# Altium schematic symbol library jlcpcb_2025_04_resistors_extended_1210.schlib: 2670 symbols (part 14 of 14) (continued)
## SCR1210JR510
designator R?  Resistance: 510mΩ  (hidden comment: *)
Resistor, 510mΩ, ±5%, 500mW, 200V, -55℃~+155℃, SMD 1210; Manufacturer: Uniroyal; Manufacturer Part Number: SCR1210JR510; Supplier 1: LCSC; Supplier Part Number 1: C3018137; JLCPCB Part Number: C3018137; Power Rating: 500mW; Category: Resistors; Package Size: 1210; JLCPCB Basic Part: Yes; Tolerance: ±5%; Voltage Rating: 200V; Temperature Rating: -55℃~+155℃; ComponentLink1Description: Datasheet; ComponentLink1URL: https://wmsc.lcsc.com/wmsc/upload/file/pdf/v2/lcsc/2205131745_VO-SCR1210JR510_C3018137.pdf; ComponentLink2Description: JLCPCB Part URL; ComponentLink2URL: https://jlcpcb.com/partdetail/C3018137
pins: 1, 2
1 alternate drawing of the same symbol

## SCR1210JR910
designator R?  Resistance: 910mΩ  (hidden comment: *)
Resistor, 910mΩ, ±5%, 500mW, 200V, -55℃~+155℃, SMD 1210; Manufacturer: Uniroyal; Manufacturer Part Number: SCR1210JR910; Supplier 1: LCSC; Supplier Part Number 1: C3018150; JLCPCB Part Number: C3018150; Power Rating: 500mW; Category: Resistors; Package Size: 1210; JLCPCB Basic Part: Yes; Tolerance: ±5%; Voltage Rating: 200V; Temperature Rating: -55℃~+155℃; ComponentLink1Description: Datasheet; ComponentLink1URL: https://wmsc.lcsc.com/wmsc/upload/file/pdf/v2/lcsc/2205131745_VO-SCR1210JR910_C3018150.pdf; ComponentLink2Description: JLCPCB Part URL; ComponentLink2URL: https://jlcpcb.com/partdetail/C3018150
pins: 1, 2
1 alternate drawing of the same symbol

## SG732ETTD100K
designator R?  Resistance: 10Ω  (hidden comment: *)
Resistor, 10Ω, ±10%, 500mW, ±200ppm/℃, -55℃~+155℃, SMD 1210; Manufacturer: Uniroyal; Manufacturer Part Number: SG732ETTD100K; Supplier 1: LCSC; Supplier Part Number 1: C782243; JLCPCB Part Number: C782243; Power Rating: 500mW; Category: Resistors; Package Size: 1210; JLCPCB Basic Part: Yes; Tolerance: ±10%; Temperature Coefficient: ±200ppm/℃; Temperature Rating: -55℃~+155℃; ComponentLink1Description: Datasheet; ComponentLink1URL: https://wmsc.lcsc.com/wmsc/upload/file/pdf/v2/lcsc/2009101908_KOA-Speer-Elec-SG732ETTD100K_C782243.pdf; ComponentLink2Description: JLCPCB Part URL; ComponentLink2URL: https://jlcpcb.com/partdetail/C782243
pins: 1, 2
1 alternate drawing of the same symbol

## SR1210JR-077R5L
designator R?  Resistance: 7.5Ω  (hidden comment: *)
Resistor, 7.5Ω, ±5%, 500mW, 200V, ±200ppm/℃, -55℃~+155℃, SMD 1210; Manufacturer: Uniroyal; Manufacturer Part Number: SR1210JR-077R5L; Supplier 1: LCSC; Supplier Part Number 1: C723671; JLCPCB Part Number: C723671; Power Rating: 500mW; Category: Resistors; Package Size: 1210; JLCPCB Basic Part: Yes; Tolerance: ±5%; Voltage Rating: 200V; Temperature Coefficient: ±200ppm/℃; Temperature Rating: -55℃~+155℃; ComponentLink1Description: Datasheet; ComponentLink1URL: https://wmsc.lcsc.com/wmsc/upload/file/pdf/v2/lcsc/2304140030_YAGEO-SR1210JR-077R5L_C723671.pdf; ComponentLink2Description: JLCPCB Part URL; ComponentLink2URL: https://jlcpcb.com/partdetail/C723671
pins: 1, 2
1 alternate drawing of the same symbol

## SR1210JR-0710RL
designator R?  Resistance: 10Ω  (hidden comment: *)
Resistor, 10Ω, ±5%, 500mW, ±200ppm/℃, -55℃~+155℃, SMD 1210; Manufacturer: Uniroyal; Manufacturer Part Number: SR1210JR-0710RL; Supplier 1: LCSC; Supplier Part Number 1: C874105; JLCPCB Part Number: C874105; Power Rating: 500mW; Category: Resistors; Package Size: 1210; JLCPCB Basic Part: Yes; Tolerance: ±5%; Temperature Coefficient: ±200ppm/℃; Temperature Rating: -55℃~+155℃; ComponentLink1Description: Datasheet; ComponentLink1URL: https://wmsc.lcsc.com/wmsc/upload/file/pdf/v2/lcsc/2311211102_YAGEO-SR1210JR-0710RL_C874105.pdf; ComponentLink2Description: JLCPCB Part URL; ComponentLink2URL: https://jlcpcb.com/partdetail/C874105
pins: 1, 2
1 alternate drawing of the same symbol

## SWR13JTEU0220
designator R?  Resistance: 22Ω  (hidden comment: *)
Resistor, 22Ω, ±5%, 500mW, 200V, ±100ppm/℃, -55℃~+155℃, SMD 1210; Manufacturer: Uniroyal; Manufacturer Part Number: SWR13JTEU0220; Supplier 1: LCSC; Supplier Part Number 1: C408951; JLCPCB Part Number: C408951; Power Rating: 500mW; Category: Resistors; Package Size: 1210; JLCPCB Basic Part: Yes; Tolerance: ±5%; Voltage Rating: 200V; Temperature Coefficient: ±100ppm/℃; Temperature Rating: -55℃~+155℃; ComponentLink1Description: Datasheet; ComponentLink1URL: https://wmsc.lcsc.com/wmsc/upload/file/pdf/v2/lcsc/1912111437_Viking-Tech-SWR13JTEU0220_C408951.pdf; ComponentLink2Description: JLCPCB Part URL; ComponentLink2URL: https://jlcpcb.com/partdetail/C408951
pins: 1, 2
1 alternate drawing of the same symbol

## TC0725B249JT5K
designator R?  Resistance: 24.9Ω  (hidden comment: *)
Resistor, 24.9Ω, ±0.1%, 333.333mW, ±25ppm/℃, SMD 1210; Manufacturer: Uniroyal; Manufacturer Part Number: TC0725B249JT5K; Supplier 1: LCSC; Supplier Part Number 1: C517711; JLCPCB Part Number: C517711; Power Rating: 333.333mW; Category: Resistors; Package Size: 1210; JLCPCB Basic Part: Yes; Tolerance: ±0.1%; Temperature Coefficient: ±25ppm/℃; ComponentLink1Description: Datasheet; ComponentLink1URL: https://wmsc.lcsc.com/wmsc/upload/file/pdf/v2/lcsc/2304140030_UNI-ROYAL-Uniroyal-Elec-TC0725B249JT5K_C517711.pdf; ComponentLink2Description: JLCPCB Part URL; ComponentLink2URL: https://jlcpcb.com/partdetail/C517711
pins: 1, 2
1 alternate drawing of the same symbol

## TC0725B4992T5K
designator R?  Resistance: 49.9kΩ  (hidden comment: *)
Resistor, 49.9kΩ, ±0.1%, 333.333mW, ±25ppm/℃, SMD 1210; Manufacturer: Uniroyal; Manufacturer Part Number: TC0725B4992T5K; Supplier 1: LCSC; Supplier Part Number 1: C517798; JLCPCB Part Number: C517798; Power Rating: 333.333mW; Category: Resistors; Package Size: 1210; JLCPCB Basic Part: Yes; Tolerance: ±0.1%; Temperature Coefficient: ±25ppm/℃; ComponentLink1Description: Datasheet; ComponentLink1URL: https://wmsc.lcsc.com/wmsc/upload/file/pdf/v2/lcsc/2304140030_UNI-ROYAL-Uniroyal-Elec-TC0725B4992T5K_C517798.pdf; ComponentLink2Description: JLCPCB Part URL; ComponentLink2URL: https://jlcpcb.com/partdetail/C517798
pins: 1, 2
1 alternate drawing of the same symbol

## TC0750B3903T5K
designator R?  Resistance: 390kΩ  (hidden comment: *)
Resistor, 390kΩ, ±0.1%, 333.333mW, ±50ppm/℃, SMD 1210; Manufacturer: Uniroyal; Manufacturer Part Number: TC0750B3903T5K; Supplier 1: LCSC; Supplier Part Number 1: C517610; JLCPCB Part Number: C517610; Power Rating: 333.333mW; Category: Resistors; Package Size: 1210; JLCPCB Basic Part: Yes; Tolerance: ±0.1%; Temperature Coefficient: ±50ppm/℃; ComponentLink1Description: Datasheet; ComponentLink1URL: https://wmsc.lcsc.com/wmsc/upload/file/pdf/v2/lcsc/2304140030_UNI-ROYAL-Uniroyal-Elec-TC0750B3903T5K_C517610.pdf; ComponentLink2Description: JLCPCB Part URL; ComponentLink2URL: https://jlcpcb.com/partdetail/C517610
pins: 1, 2
1 alternate drawing of the same symbol

## TR1210B100RP0550Z
designator R?  Resistance: 100Ω  (hidden comment: *)
Resistor, 100Ω, ±0.1%, 250mW, 200V, ±50ppm/℃, -55℃~+155℃, SMD 1210; Manufacturer: Uniroyal; Manufacturer Part Number: TR1210B100RP0550Z; Supplier 1: LCSC; Supplier Part Number 1: C153399; JLCPCB Part Number: C153399; Power Rating: 250mW; Category: Resistors; Package Size: 1210; JLCPCB Basic Part: Yes; Tolerance: ±0.1%; Voltage Rating: 200V; Temperature Coefficient: ±50ppm/℃; Temperature Rating: -55℃~+155℃; ComponentLink1Description: Datasheet; ComponentLink1URL: https://wmsc.lcsc.com/wmsc/upload/file/pdf/v2/lcsc/2304140030_Ever-Ohms-Tech-TR1210B100RP0550Z_C153399.pdf; ComponentLink2Description: JLCPCB Part URL; ComponentLink2URL: https://jlcpcb.com/partdetail/C153399
pins: 1, 2
1 alternate drawing of the same symbol

## TR1210D261KP0525
designator R?  Resistance: 261kΩ  (hidden comment: *)
Resistor, 261kΩ, ±0.5%, 250mW, 200V, ±25ppm/℃, -55℃~+155℃, SMD 1210; Manufacturer: Uniroyal; Manufacturer Part Number: TR1210D261KP0525; Supplier 1: LCSC; Supplier Part Number 1: C153314; JLCPCB Part Number: C153314; Power Rating: 250mW; Category: Resistors; Package Size: 1210; JLCPCB Basic Part: Yes; Tolerance: ±0.5%; Voltage Rating: 200V; Temperature Coefficient: ±25ppm/℃; Temperature Rating: -55℃~+155℃; ComponentLink1Description: Datasheet; ComponentLink1URL: https://wmsc.lcsc.com/wmsc/upload/file/pdf/v2/lcsc/2304140030_Ever-Ohms-Tech-TR1210D261KP0525_C153314.pdf; ComponentLink2Description: JLCPCB Part URL; ComponentLink2URL: https://jlcpcb.com/partdetail/C153314
pins: 1, 2
1 alternate drawing of the same symbol

## WR10W1R00FTL
designator R?  Resistance: 1Ω  (hidden comment: *)
Resistor, 1Ω, ±1%, 333.333mW, 200V, -200ppm/℃~+400ppm/℃, -55℃~+155℃, SMD 1210; Manufacturer: Uniroyal; Manufacturer Part Number: WR10W1R00FTL; Supplier 1: LCSC; Supplier Part Number 1: C171204; JLCPCB Part Number: C171204; Power Rating: 333.333mW; Category: Resistors; Package Size: 1210; JLCPCB Basic Part: Yes; Tolerance: ±1%; Voltage Rating: 200V; Temperature Coefficient: -200ppm/℃~+400ppm/℃; Temperature Rating: -55℃~+155℃; ComponentLink1Description: Datasheet; ComponentLink1URL: https://wmsc.lcsc.com/wmsc/upload/file/pdf/v2/lcsc/2304140030_Walsin-Tech-Corp-WR10W1R00FTL_C171204.pdf; ComponentLink2Description: JLCPCB Part URL; ComponentLink2URL: https://jlcpcb.com/partdetail/C171204
pins: 1, 2
1 alternate drawing of the same symbol

## WR10W6R80FTL
designator R?  Resistance: 6.8Ω  (hidden comment: *)
Resistor, 6.8Ω, ±1%, 333.333mW, 200V, -200ppm/℃~+400ppm/℃, -55℃~+155℃, SMD 1210; Manufacturer: Uniroyal; Manufacturer Part Number: WR10W6R80FTL; Supplier 1: LCSC; Supplier Part Number 1: C171209; JLCPCB Part Number: C171209; Power Rating: 333.333mW; Category: Resistors; Package Size: 1210; JLCPCB Basic Part: Yes; Tolerance: ±1%; Voltage Rating: 200V; Temperature Coefficient: -200ppm/℃~+400ppm/℃; Temperature Rating: -55℃~+155℃; ComponentLink1Description: Datasheet; ComponentLink1URL: https://wmsc.lcsc.com/wmsc/upload/file/pdf/v2/lcsc/2304140030_Walsin-Tech-Corp-WR10W6R80FTL_C171209.pdf; ComponentLink2Description: JLCPCB Part URL; ComponentLink2URL: https://jlcpcb.com/partdetail/C171209
pins: 1, 2
1 alternate drawing of the same symbol

## WR10X000PTL
designator R?  Resistance: 0Ω  (hidden comment: *)
Resistor, 0Ω, 333.333mW, 200V, -200ppm/℃~+400ppm/℃, -55℃~+155℃, SMD 1210; Manufacturer: Uniroyal; Manufacturer Part Number: WR10X000PTL; Supplier 1: LCSC; Supplier Part Number 1: C168595; JLCPCB Part Number: C168595; Power Rating: 333.333mW; Category: Resistors; Package Size: 1210; JLCPCB Basic Part: Yes; Voltage Rating: 200V; Temperature Coefficient: -200ppm/℃~+400ppm/℃; Temperature Rating: -55℃~+155℃; ComponentLink1Description: Datasheet; ComponentLink1URL: https://wmsc.lcsc.com/wmsc/upload/file/pdf/v2/lcsc/2304140030_Walsin-Tech-Corp-WR10X000PTL_C168595.pdf; ComponentLink2Description: JLCPCB Part URL; ComponentLink2URL: https://jlcpcb.com/partdetail/C168595
pins: 1, 2
1 alternate drawing of the same symbol

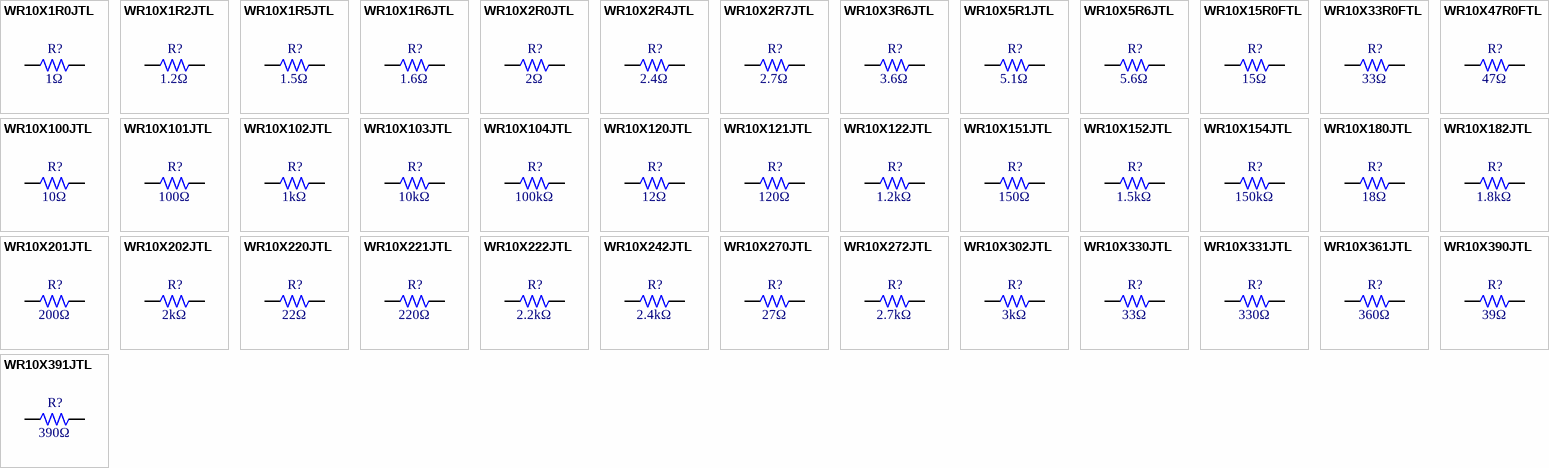
[diagram p65: symbols WR10X1R0JTL to WR10X391JTL]

## WR10X1R0JTL
designator R?  Resistance: 1Ω  (hidden comment: *)
Resistor, 1Ω, ±5%, 333.333mW, 200V, ±200ppm/℃, -55℃~+155℃, SMD 1210; Manufacturer: Uniroyal; Manufacturer Part Number: WR10X1R0JTL; Supplier 1: LCSC; Supplier Part Number 1: C171220; JLCPCB Part Number: C171220; Power Rating: 333.333mW; Category: Resistors; Package Size: 1210; JLCPCB Basic Part: Yes; Tolerance: ±5%; Voltage Rating: 200V; Temperature Coefficient: ±200ppm/℃; Temperature Rating: -55℃~+155℃; ComponentLink1Description: Datasheet; ComponentLink1URL: https://wmsc.lcsc.com/wmsc/upload/file/pdf/v2/lcsc/2304140030_Walsin-Tech-Corp-WR10X1R0JTL_C171220.pdf; ComponentLink2Description: JLCPCB Part URL; ComponentLink2URL: https://jlcpcb.com/partdetail/C171220
pins: 1, 2
1 alternate drawing of the same symbol

## WR10X1R2JTL
designator R?  Resistance: 1.2Ω  (hidden comment: *)
Resistor, 1.2Ω, ±5%, 333.333mW, 200V, -200ppm/℃~+400ppm/℃, -55℃~+155℃, SMD 1210; Manufacturer: Uniroyal; Manufacturer Part Number: WR10X1R2JTL; Supplier 1: LCSC; Supplier Part Number 1: C171221; JLCPCB Part Number: C171221; Power Rating: 333.333mW; Category: Resistors; Package Size: 1210; JLCPCB Basic Part: Yes; Tolerance: ±5%; Voltage Rating: 200V; Temperature Coefficient: -200ppm/℃~+400ppm/℃; Temperature Rating: -55℃~+155℃; ComponentLink1Description: Datasheet; ComponentLink1URL: https://wmsc.lcsc.com/wmsc/upload/file/pdf/v2/lcsc/2304140030_Walsin-Tech-Corp-WR10X1R2JTL_C171221.pdf; ComponentLink2Description: JLCPCB Part URL; ComponentLink2URL: https://jlcpcb.com/partdetail/C171221
pins: 1, 2
1 alternate drawing of the same symbol

## WR10X1R5JTL
designator R?  Resistance: 1.5Ω  (hidden comment: *)
Resistor, 1.5Ω, ±5%, 333.333mW, 200V, -200ppm/℃~+400ppm/℃, -55℃~+155℃, SMD 1210; Manufacturer: Uniroyal; Manufacturer Part Number: WR10X1R5JTL; Supplier 1: LCSC; Supplier Part Number 1: C171222; JLCPCB Part Number: C171222; Power Rating: 333.333mW; Category: Resistors; Package Size: 1210; JLCPCB Basic Part: Yes; Tolerance: ±5%; Voltage Rating: 200V; Temperature Coefficient: -200ppm/℃~+400ppm/℃; Temperature Rating: -55℃~+155℃; ComponentLink1Description: Datasheet; ComponentLink1URL: https://wmsc.lcsc.com/wmsc/upload/file/pdf/v2/lcsc/1810162141_Walsin-Tech-Corp-WR10X1R5JTL_C171222.pdf; ComponentLink2Description: JLCPCB Part URL; ComponentLink2URL: https://jlcpcb.com/partdetail/C171222
pins: 1, 2
1 alternate drawing of the same symbol

## WR10X1R6JTL
designator R?  Resistance: 1.6Ω  (hidden comment: *)
Resistor, 1.6Ω, ±5%, 333.333mW, 200V, ±200ppm/℃, -55℃~+155℃, SMD 1210; Manufacturer: Uniroyal; Manufacturer Part Number: WR10X1R6JTL; Supplier 1: LCSC; Supplier Part Number 1: C470035; JLCPCB Part Number: C470035; Power Rating: 333.333mW; Category: Resistors; Package Size: 1210; JLCPCB Basic Part: Yes; Tolerance: ±5%; Voltage Rating: 200V; Temperature Coefficient: ±200ppm/℃; Temperature Rating: -55℃~+155℃; ComponentLink1Description: Datasheet; ComponentLink1URL: https://wmsc.lcsc.com/wmsc/upload/file/pdf/v2/lcsc/1912210907_Walsin-Tech-Corp-WR10X1R6JTL_C470035.pdf; ComponentLink2Description: JLCPCB Part URL; ComponentLink2URL: https://jlcpcb.com/partdetail/C470035
pins: 1, 2
1 alternate drawing of the same symbol

## WR10X2R0JTL
designator R?  Resistance: 2Ω  (hidden comment: *)
Resistor, 2Ω, ±5%, 333.333mW, 200V, -200ppm/℃~+400ppm/℃, -55℃~+155℃, SMD 1210; Manufacturer: Uniroyal; Manufacturer Part Number: WR10X2R0JTL; Supplier 1: LCSC; Supplier Part Number 1: C171232; JLCPCB Part Number: C171232; Power Rating: 333.333mW; Category: Resistors; Package Size: 1210; JLCPCB Basic Part: Yes; Tolerance: ±5%; Voltage Rating: 200V; Temperature Coefficient: -200ppm/℃~+400ppm/℃; Temperature Rating: -55℃~+155℃; ComponentLink1Description: Datasheet; ComponentLink1URL: https://wmsc.lcsc.com/wmsc/upload/file/pdf/v2/lcsc/2304140030_Walsin-Tech-Corp-WR10X2R0JTL_C171232.pdf; ComponentLink2Description: JLCPCB Part URL; ComponentLink2URL: https://jlcpcb.com/partdetail/C171232
pins: 1, 2
1 alternate drawing of the same symbol

## WR10X2R4JTL
designator R?  Resistance: 2.4Ω  (hidden comment: *)
Resistor, 2.4Ω, ±5%, 333.333mW, 200V, -200ppm/℃~+400ppm/℃, -55℃~+155℃, SMD 1210; Manufacturer: Uniroyal; Manufacturer Part Number: WR10X2R4JTL; Supplier 1: LCSC; Supplier Part Number 1: C171234; JLCPCB Part Number: C171234; Power Rating: 333.333mW; Category: Resistors; Package Size: 1210; JLCPCB Basic Part: Yes; Tolerance: ±5%; Voltage Rating: 200V; Temperature Coefficient: -200ppm/℃~+400ppm/℃; Temperature Rating: -55℃~+155℃; ComponentLink1Description: Datasheet; ComponentLink1URL: https://wmsc.lcsc.com/wmsc/upload/file/pdf/v2/lcsc/2304140030_Walsin-Tech-Corp-WR10X2R4JTL_C171234.pdf; ComponentLink2Description: JLCPCB Part URL; ComponentLink2URL: https://jlcpcb.com/partdetail/C171234
pins: 1, 2
1 alternate drawing of the same symbol

## WR10X2R7JTL
designator R?  Resistance: 2.7Ω  (hidden comment: *)
Resistor, 2.7Ω, ±5%, 333.333mW, 200V, ±200ppm/℃, -55℃~+155℃, SMD 1210; Manufacturer: Uniroyal; Manufacturer Part Number: WR10X2R7JTL; Supplier 1: LCSC; Supplier Part Number 1: C470036; JLCPCB Part Number: C470036; Power Rating: 333.333mW; Category: Resistors; Package Size: 1210; JLCPCB Basic Part: Yes; Tolerance: ±5%; Voltage Rating: 200V; Temperature Coefficient: ±200ppm/℃; Temperature Rating: -55℃~+155℃; ComponentLink1Description: Datasheet; ComponentLink1URL: https://wmsc.lcsc.com/wmsc/upload/file/pdf/v2/lcsc/2304140030_Walsin-Tech-Corp-WR10X2R7JTL_C470036.pdf; ComponentLink2Description: JLCPCB Part URL; ComponentLink2URL: https://jlcpcb.com/partdetail/C470036
pins: 1, 2
1 alternate drawing of the same symbol

## WR10X3R6JTL
designator R?  Resistance: 3.6Ω  (hidden comment: *)
Resistor, 3.6Ω, ±5%, 333.333mW, 200V, -200ppm/℃~+400ppm/℃, -55℃~+155℃, SMD 1210; Manufacturer: Uniroyal; Manufacturer Part Number: WR10X3R6JTL; Supplier 1: LCSC; Supplier Part Number 1: C396216; JLCPCB Part Number: C396216; Power Rating: 333.333mW; Category: Resistors; Package Size: 1210; JLCPCB Basic Part: Yes; Tolerance: ±5%; Voltage Rating: 200V; Temperature Coefficient: -200ppm/℃~+400ppm/℃; Temperature Rating: -55℃~+155℃; ComponentLink1Description: Datasheet; ComponentLink1URL: https://wmsc.lcsc.com/wmsc/upload/file/pdf/v2/lcsc/2304140030_Walsin-Tech-Corp-WR10X3R6JTL_C396216.pdf; ComponentLink2Description: JLCPCB Part URL; ComponentLink2URL: https://jlcpcb.com/partdetail/C396216
pins: 1, 2
1 alternate drawing of the same symbol

## WR10X5R1JTL
designator R?  Resistance: 5.1Ω  (hidden comment: *)
Resistor, 5.1Ω, ±5%, 333.333mW, 200V, -200ppm/℃~+400ppm/℃, -55℃~+155℃, SMD 1210; Manufacturer: Uniroyal; Manufacturer Part Number: WR10X5R1JTL; Supplier 1: LCSC; Supplier Part Number 1: C171251; JLCPCB Part Number: C171251; Power Rating: 333.333mW; Category: Resistors; Package Size: 1210; JLCPCB Basic Part: Yes; Tolerance: ±5%; Voltage Rating: 200V; Temperature Coefficient: -200ppm/℃~+400ppm/℃; Temperature Rating: -55℃~+155℃; ComponentLink1Description: Datasheet; ComponentLink1URL: https://wmsc.lcsc.com/wmsc/upload/file/pdf/v2/lcsc/2304140030_Walsin-Tech-Corp-WR10X5R1JTL_C171251.pdf; ComponentLink2Description: JLCPCB Part URL; ComponentLink2URL: https://jlcpcb.com/partdetail/C171251
pins: 1, 2
1 alternate drawing of the same symbol

## WR10X5R6JTL
designator R?  Resistance: 5.6Ω  (hidden comment: *)
Resistor, 5.6Ω, ±5%, 333.333mW, 200V, -200ppm/℃~+400ppm/℃, -55℃~+155℃, SMD 1210; Manufacturer: Uniroyal; Manufacturer Part Number: WR10X5R6JTL; Supplier 1: LCSC; Supplier Part Number 1: C171252; JLCPCB Part Number: C171252; Power Rating: 333.333mW; Category: Resistors; Package Size: 1210; JLCPCB Basic Part: Yes; Tolerance: ±5%; Voltage Rating: 200V; Temperature Coefficient: -200ppm/℃~+400ppm/℃; Temperature Rating: -55℃~+155℃; ComponentLink1Description: Datasheet; ComponentLink1URL: https://wmsc.lcsc.com/wmsc/upload/file/pdf/v2/lcsc/2304140030_Walsin-Tech-Corp-WR10X5R6JTL_C171252.pdf; ComponentLink2Description: JLCPCB Part URL; ComponentLink2URL: https://jlcpcb.com/partdetail/C171252
pins: 1, 2
1 alternate drawing of the same symbol

## WR10X15R0FTL
designator R?  Resistance: 15Ω  (hidden comment: *)
Resistor, 15Ω, ±1%, 333.333mW, ±100ppm/℃, SMD 1210; Manufacturer: Uniroyal; Manufacturer Part Number: WR10X15R0FTL; Supplier 1: LCSC; Supplier Part Number 1: C384050; JLCPCB Part Number: C384050; Power Rating: 333.333mW; Category: Resistors; Package Size: 1210; JLCPCB Basic Part: Yes; Tolerance: ±1%; Temperature Coefficient: ±100ppm/℃; ComponentLink1Description: Datasheet; ComponentLink1URL: https://wmsc.lcsc.com/wmsc/upload/file/pdf/v2/lcsc/2304140030_Walsin-Tech-Corp-WR10X15R0FTL_C384050.pdf; ComponentLink2Description: JLCPCB Part URL; ComponentLink2URL: https://jlcpcb.com/partdetail/C384050
pins: 1, 2
1 alternate drawing of the same symbol

## WR10X33R0FTL
designator R?  Resistance: 33Ω  (hidden comment: *)
Resistor, 33Ω, ±1%, 50mW, 25V, ±200ppm/℃, -55℃~+125℃, SMD 1210; Manufacturer: Uniroyal; Manufacturer Part Number: WR10X33R0FTL; Supplier 1: LCSC; Supplier Part Number 1: C2894216; JLCPCB Part Number: C2894216; Power Rating: 50mW; Category: Resistors; Package Size: 1210; JLCPCB Basic Part: Yes; Tolerance: ±1%; Voltage Rating: 25V; Temperature Coefficient: ±200ppm/℃; Temperature Rating: -55℃~+125℃; ComponentLink1Description: Datasheet; ComponentLink1URL: https://wmsc.lcsc.com/wmsc/upload/file/pdf/v2/lcsc/2109081830_Walsin-Tech-Corp-WR10X33R0FTL_C2894216.pdf; ComponentLink2Description: JLCPCB Part URL; ComponentLink2URL: https://jlcpcb.com/partdetail/C2894216
pins: 1, 2
1 alternate drawing of the same symbol

## WR10X47R0FTL
designator R?  Resistance: 47Ω  (hidden comment: *)
Resistor, 47Ω, ±1%, 333.333mW, 200V, ±100ppm/℃, -55℃~+155℃, SMD 1210; Manufacturer: Uniroyal; Manufacturer Part Number: WR10X47R0FTL; Supplier 1: LCSC; Supplier Part Number 1: C335013; JLCPCB Part Number: C335013; Power Rating: 333.333mW; Category: Resistors; Package Size: 1210; JLCPCB Basic Part: Yes; Tolerance: ±1%; Voltage Rating: 200V; Temperature Coefficient: ±100ppm/℃; Temperature Rating: -55℃~+155℃; ComponentLink1Description: Datasheet; ComponentLink1URL: https://wmsc.lcsc.com/wmsc/upload/file/pdf/v2/lcsc/2304140030_Walsin-Tech-Corp-WR10X47R0FTL_C335013.pdf; ComponentLink2Description: JLCPCB Part URL; ComponentLink2URL: https://jlcpcb.com/partdetail/C335013
pins: 1, 2
1 alternate drawing of the same symbol

## WR10X100JTL
designator R?  Resistance: 10Ω  (hidden comment: *)
Resistor, 10Ω, ±5%, 333.333mW, 200V, ±200ppm/℃, -55℃~+155℃, SMD 1210; Manufacturer: Uniroyal; Manufacturer Part Number: WR10X100JTL; Supplier 1: LCSC; Supplier Part Number 1: C396213; JLCPCB Part Number: C396213; Power Rating: 333.333mW; Category: Resistors; Package Size: 1210; JLCPCB Basic Part: Yes; Tolerance: ±5%; Voltage Rating: 200V; Temperature Coefficient: ±200ppm/℃; Temperature Rating: -55℃~+155℃; ComponentLink1Description: Datasheet; ComponentLink1URL: https://wmsc.lcsc.com/wmsc/upload/file/pdf/v2/lcsc/2110281730_Walsin-Tech-Corp-WR10X100JTL_C396213.pdf; ComponentLink2Description: JLCPCB Part URL; ComponentLink2URL: https://jlcpcb.com/partdetail/C396213
pins: 1, 2
1 alternate drawing of the same symbol

## WR10X101JTL
designator R?  Resistance: 100Ω  (hidden comment: *)
Resistor, 100Ω, ±5%, 333.333mW, 200V, ±100ppm/℃, -55℃~+155℃, SMD 1210; Manufacturer: Uniroyal; Manufacturer Part Number: WR10X101JTL; Supplier 1: LCSC; Supplier Part Number 1: C168597; JLCPCB Part Number: C168597; Power Rating: 333.333mW; Category: Resistors; Package Size: 1210; JLCPCB Basic Part: Yes; Tolerance: ±5%; Voltage Rating: 200V; Temperature Coefficient: ±100ppm/℃; Temperature Rating: -55℃~+155℃; ComponentLink1Description: Datasheet; ComponentLink1URL: https://wmsc.lcsc.com/wmsc/upload/file/pdf/v2/lcsc/2304140030_Walsin-Tech-Corp-WR10X101JTL_C168597.pdf; ComponentLink2Description: JLCPCB Part URL; ComponentLink2URL: https://jlcpcb.com/partdetail/C168597
pins: 1, 2
1 alternate drawing of the same symbol

## WR10X102JTL
designator R?  Resistance: 1kΩ  (hidden comment: *)
Resistor, 1kΩ, ±5%, 333.333mW, 200V, ±100ppm/℃, -55℃~+155℃, SMD 1210; Manufacturer: Uniroyal; Manufacturer Part Number: WR10X102JTL; Supplier 1: LCSC; Supplier Part Number 1: C171210; JLCPCB Part Number: C171210; Power Rating: 333.333mW; Category: Resistors; Package Size: 1210; JLCPCB Basic Part: Yes; Tolerance: ±5%; Voltage Rating: 200V; Temperature Coefficient: ±100ppm/℃; Temperature Rating: -55℃~+155℃; ComponentLink1Description: Datasheet; ComponentLink1URL: https://wmsc.lcsc.com/wmsc/upload/file/pdf/v2/lcsc/2304140030_Walsin-Tech-Corp-WR10X102JTL_C171210.pdf; ComponentLink2Description: JLCPCB Part URL; ComponentLink2URL: https://jlcpcb.com/partdetail/C171210
pins: 1, 2
1 alternate drawing of the same symbol

## WR10X103JTL
designator R?  Resistance: 10kΩ  (hidden comment: *)
Resistor, 10kΩ, ±5%, 333.333mW, 200V, ±100ppm/℃, -55℃~+155℃, SMD 1210; Manufacturer: Uniroyal; Manufacturer Part Number: WR10X103JTL; Supplier 1: LCSC; Supplier Part Number 1: C171211; JLCPCB Part Number: C171211; Power Rating: 333.333mW; Category: Resistors; Package Size: 1210; JLCPCB Basic Part: Yes; Tolerance: ±5%; Voltage Rating: 200V; Temperature Coefficient: ±100ppm/℃; Temperature Rating: -55℃~+155℃; ComponentLink1Description: Datasheet; ComponentLink1URL: https://wmsc.lcsc.com/wmsc/upload/file/pdf/v2/lcsc/2304140030_Walsin-Tech-Corp-WR10X103JTL_C171211.pdf; ComponentLink2Description: JLCPCB Part URL; ComponentLink2URL: https://jlcpcb.com/partdetail/C171211
pins: 1, 2
1 alternate drawing of the same symbol

## WR10X104JTL
designator R?  Resistance: 100kΩ  (hidden comment: *)
Resistor, 100kΩ, ±5%, 333.333mW, 200V, ±100ppm/℃, -55℃~+155℃, SMD 1210; Manufacturer: Uniroyal; Manufacturer Part Number: WR10X104JTL; Supplier 1: LCSC; Supplier Part Number 1: C171254; JLCPCB Part Number: C171254; Power Rating: 333.333mW; Category: Resistors; Package Size: 1210; JLCPCB Basic Part: Yes; Tolerance: ±5%; Voltage Rating: 200V; Temperature Coefficient: ±100ppm/℃; Temperature Rating: -55℃~+155℃; ComponentLink1Description: Datasheet; ComponentLink1URL: https://wmsc.lcsc.com/wmsc/upload/file/pdf/v2/lcsc/2304140030_Walsin-Tech-Corp-WR10X104JTL_C171254.pdf; ComponentLink2Description: JLCPCB Part URL; ComponentLink2URL: https://jlcpcb.com/partdetail/C171254
pins: 1, 2
1 alternate drawing of the same symbol

## WR10X120JTL
designator R?  Resistance: 12Ω  (hidden comment: *)
Resistor, 12Ω, ±5%, 333.333mW, 200V, ±100ppm/℃, -55℃~+155℃, SMD 1210; Manufacturer: Uniroyal; Manufacturer Part Number: WR10X120JTL; Supplier 1: LCSC; Supplier Part Number 1: C171213; JLCPCB Part Number: C171213; Power Rating: 333.333mW; Category: Resistors; Package Size: 1210; JLCPCB Basic Part: Yes; Tolerance: ±5%; Voltage Rating: 200V; Temperature Coefficient: ±100ppm/℃; Temperature Rating: -55℃~+155℃; ComponentLink1Description: Datasheet; ComponentLink1URL: https://wmsc.lcsc.com/wmsc/upload/file/pdf/v2/lcsc/2304140030_Walsin-Tech-Corp-WR10X120JTL_C171213.pdf; ComponentLink2Description: JLCPCB Part URL; ComponentLink2URL: https://jlcpcb.com/partdetail/C171213
pins: 1, 2
1 alternate drawing of the same symbol

## WR10X121JTL
designator R?  Resistance: 120Ω  (hidden comment: *)
Resistor, 120Ω, ±5%, 333.333mW, 200V, ±100ppm/℃, -55℃~+155℃, SMD 1210; Manufacturer: Uniroyal; Manufacturer Part Number: WR10X121JTL; Supplier 1: LCSC; Supplier Part Number 1: C171214; JLCPCB Part Number: C171214; Power Rating: 333.333mW; Category: Resistors; Package Size: 1210; JLCPCB Basic Part: Yes; Tolerance: ±5%; Voltage Rating: 200V; Temperature Coefficient: ±100ppm/℃; Temperature Rating: -55℃~+155℃; ComponentLink1Description: Datasheet; ComponentLink1URL: https://wmsc.lcsc.com/wmsc/upload/file/pdf/v2/lcsc/2304140030_Walsin-Tech-Corp-WR10X121JTL_C171214.pdf; ComponentLink2Description: JLCPCB Part URL; ComponentLink2URL: https://jlcpcb.com/partdetail/C171214
pins: 1, 2
1 alternate drawing of the same symbol

## WR10X122JTL
designator R?  Resistance: 1.2kΩ  (hidden comment: *)
Resistor, 1.2kΩ, ±5%, 333.333mW, 200V, ±100ppm/℃, -55℃~+155℃, SMD 1210; Manufacturer: Uniroyal; Manufacturer Part Number: WR10X122JTL; Supplier 1: LCSC; Supplier Part Number 1: C171215; JLCPCB Part Number: C171215; Power Rating: 333.333mW; Category: Resistors; Package Size: 1210; JLCPCB Basic Part: Yes; Tolerance: ±5%; Voltage Rating: 200V; Temperature Coefficient: ±100ppm/℃; Temperature Rating: -55℃~+155℃; ComponentLink1Description: Datasheet; ComponentLink1URL: https://wmsc.lcsc.com/wmsc/upload/file/pdf/v2/lcsc/2304140030_Walsin-Tech-Corp-WR10X122JTL_C171215.pdf; ComponentLink2Description: JLCPCB Part URL; ComponentLink2URL: https://jlcpcb.com/partdetail/C171215
pins: 1, 2
1 alternate drawing of the same symbol

## WR10X151JTL
designator R?  Resistance: 150Ω  (hidden comment: *)
Resistor, 150Ω, ±5%, 333.333mW, 200V, ±100ppm/℃, -55℃~+155℃, SMD 1210; Manufacturer: Uniroyal; Manufacturer Part Number: WR10X151JTL; Supplier 1: LCSC; Supplier Part Number 1: C171216; JLCPCB Part Number: C171216; Power Rating: 333.333mW; Category: Resistors; Package Size: 1210; JLCPCB Basic Part: Yes; Tolerance: ±5%; Voltage Rating: 200V; Temperature Coefficient: ±100ppm/℃; Temperature Rating: -55℃~+155℃; ComponentLink1Description: Datasheet; ComponentLink1URL: https://wmsc.lcsc.com/wmsc/upload/file/pdf/v2/lcsc/2304140030_Walsin-Tech-Corp-WR10X151JTL_C171216.pdf; ComponentLink2Description: JLCPCB Part URL; ComponentLink2URL: https://jlcpcb.com/partdetail/C171216
pins: 1, 2
1 alternate drawing of the same symbol

## WR10X152JTL
designator R?  Resistance: 1.5kΩ  (hidden comment: *)
Resistor, 1.5kΩ, ±5%, 333.333mW, 200V, ±100ppm/℃, -55℃~+155℃, SMD 1210; Manufacturer: Uniroyal; Manufacturer Part Number: WR10X152JTL; Supplier 1: LCSC; Supplier Part Number 1: C171217; JLCPCB Part Number: C171217; Power Rating: 333.333mW; Category: Resistors; Package Size: 1210; JLCPCB Basic Part: Yes; Tolerance: ±5%; Voltage Rating: 200V; Temperature Coefficient: ±100ppm/℃; Temperature Rating: -55℃~+155℃; ComponentLink1Description: Datasheet; ComponentLink1URL: https://wmsc.lcsc.com/wmsc/upload/file/pdf/v2/lcsc/2304140030_Walsin-Tech-Corp-WR10X152JTL_C171217.pdf; ComponentLink2Description: JLCPCB Part URL; ComponentLink2URL: https://jlcpcb.com/partdetail/C171217
pins: 1, 2
1 alternate drawing of the same symbol

## WR10X154JTL
designator R?  Resistance: 150kΩ  (hidden comment: *)
Resistor, 150kΩ, ±5%, 333.333mW, 200V, ±100ppm/℃, -55℃~+155℃, SMD 1210; Manufacturer: Uniroyal; Manufacturer Part Number: WR10X154JTL; Supplier 1: LCSC; Supplier Part Number 1: C171218; JLCPCB Part Number: C171218; Power Rating: 333.333mW; Category: Resistors; Package Size: 1210; JLCPCB Basic Part: Yes; Tolerance: ±5%; Voltage Rating: 200V; Temperature Coefficient: ±100ppm/℃; Temperature Rating: -55℃~+155℃; ComponentLink1Description: Datasheet; ComponentLink1URL: https://wmsc.lcsc.com/wmsc/upload/file/pdf/v2/lcsc/2304140030_Walsin-Tech-Corp-WR10X154JTL_C171218.pdf; ComponentLink2Description: JLCPCB Part URL; ComponentLink2URL: https://jlcpcb.com/partdetail/C171218
pins: 1, 2
1 alternate drawing of the same symbol

## WR10X180JTL
designator R?  Resistance: 18Ω  (hidden comment: *)
Resistor, 18Ω, ±5%, 333.333mW, 200V, ±100ppm/℃, -55℃~+155℃, SMD 1210; Manufacturer: Uniroyal; Manufacturer Part Number: WR10X180JTL; Supplier 1: LCSC; Supplier Part Number 1: C171219; JLCPCB Part Number: C171219; Power Rating: 333.333mW; Category: Resistors; Package Size: 1210; JLCPCB Basic Part: Yes; Tolerance: ±5%; Voltage Rating: 200V; Temperature Coefficient: ±100ppm/℃; Temperature Rating: -55℃~+155℃; ComponentLink1Description: Datasheet; ComponentLink1URL: https://wmsc.lcsc.com/wmsc/upload/file/pdf/v2/lcsc/2304140030_Walsin-Tech-Corp-WR10X180JTL_C171219.pdf; ComponentLink2Description: JLCPCB Part URL; ComponentLink2URL: https://jlcpcb.com/partdetail/C171219
pins: 1, 2
1 alternate drawing of the same symbol

## WR10X182JTL
designator R?  Resistance: 1.8kΩ  (hidden comment: *)
Resistor, 1.8kΩ, ±5%, 333.333mW, 200V, ±100ppm/℃, -55℃~+155℃, SMD 1210; Manufacturer: Uniroyal; Manufacturer Part Number: WR10X182JTL; Supplier 1: LCSC; Supplier Part Number 1: C396214; JLCPCB Part Number: C396214; Power Rating: 333.333mW; Category: Resistors; Package Size: 1210; JLCPCB Basic Part: Yes; Tolerance: ±5%; Voltage Rating: 200V; Temperature Coefficient: ±100ppm/℃; Temperature Rating: -55℃~+155℃; ComponentLink1Description: Datasheet; ComponentLink1URL: https://wmsc.lcsc.com/wmsc/upload/file/pdf/v2/lcsc/2304140030_Walsin-Tech-Corp-WR10X182JTL_C396214.pdf; ComponentLink2Description: JLCPCB Part URL; ComponentLink2URL: https://jlcpcb.com/partdetail/C396214
pins: 1, 2
1 alternate drawing of the same symbol

## WR10X201JTL
designator R?  Resistance: 200Ω  (hidden comment: *)
Resistor, 200Ω, ±5%, 333.333mW, 200V, ±100ppm/℃, -55℃~+155℃, SMD 1210; Manufacturer: Uniroyal; Manufacturer Part Number: WR10X201JTL; Supplier 1: LCSC; Supplier Part Number 1: C171224; JLCPCB Part Number: C171224; Power Rating: 333.333mW; Category: Resistors; Package Size: 1210; JLCPCB Basic Part: Yes; Tolerance: ±5%; Voltage Rating: 200V; Temperature Coefficient: ±100ppm/℃; Temperature Rating: -55℃~+155℃; ComponentLink1Description: Datasheet; ComponentLink1URL: https://wmsc.lcsc.com/wmsc/upload/file/pdf/v2/lcsc/2304140030_Walsin-Tech-Corp-WR10X201JTL_C171224.pdf; ComponentLink2Description: JLCPCB Part URL; ComponentLink2URL: https://jlcpcb.com/partdetail/C171224
pins: 1, 2
1 alternate drawing of the same symbol
